# Altium integrated library Mylib Rev 4.IntLib: 207 symbols (part 2 of 3) (continued)
## Header 13
designator P?
Header, 13-Pin; ASiD Part Number: Header 13-AS
footprint MY_1X13_Black
footprint MY_FE13
footprint MY_FE13W
footprint MY_MA13-1
footprint MY_MA13-1W
pins: 1, 2, 3, 4, 5, 6, 7, 8, 9, 10, 11, 12, 13

## Header 13X2
designator P?  (value not drawn)
Header, 26-Pin, Dual row; ASiD Part Number: Header 13X2-AS
footprint My_2X13
footprint MY_2X13_BOX
footprint MY_ML26L
footprint MY_FE13-2
footprint MY_FE13-2W
footprint MY_MA13-2W
pins: 1, 2, 3, 4, 5, 6, 7, 8, 9, 10, 11, 12, 13, 14, 15, 16, 17, 18, 19, 20, 21, 22, 23, 24, 25, 26

## Header 14
designator P?  (value not drawn)
Header, 14-Pin; ASiD Part Number: Header 14-AS
footprint My_1X14
signal-integrity model Connector
footprint MY_FE14
footprint MY_FE14W
footprint MY_MA14-1W
pins: 1, 2, 3, 4, 5, 6, 7, 8, 9, 10, 11, 12, 13, 14

## Header 15
designator P?  (value not drawn)
Header, 15-Pin; ASiD Part Number: Header 15-AS
signal-integrity model Connector
footprint MY_53253-1570
footprint MY_FE15
footprint MY_FE15W
footprint MY_1x15
footprint MY_MA15-1W
pins: 1, 2, 3, 4, 5, 6, 7, 8, 9, 10, 11, 12, 13, 14, 15

## Header 15X2
designator P?
Header, 30-Pin, Dual row; ASiD Part Number: Header 15X2-AS
footprint MY_FE15-2
footprint MY_FE15-2W
footprint MY_MA15-2W
footprint MY_2X15
pins: 1, 2, 3, 4, 5, 6, 7, 8, 9, 10, 11, 12, 13, 14, 15, 16, 17, 18, 19, 20, 21, 22, 23, 24, 25, 26, 27, 28, 29, 30

## Header 16
designator P?  (value not drawn)
Header, 16-Pin; ASiD Part Number: Header 16-AS
footprint My_1X16
signal-integrity model Connector
footprint MY_FE16
footprint MY_FE16W
footprint MY_MA16-1W
pins: 1, 2, 3, 4, 5, 6, 7, 8, 9, 10, 11, 12, 13, 14, 15, 16

## Header 16X2
designator P?
Header, 32-Pin, Dual row; ASiD Part Number: Header 16X2-AS
footprint MY_16X2
footprint MY_16X2R
footprint MY_2x16
footprint MY_FE16-2
footprint MY_FE16-2W
footprint MY_MA16-2W
pins: 1, 2, 3, 4, 5, 6, 7, 8, 9, 10, 11, 12, 13, 14, 15, 16, 17, 18, 19, 20, 21, 22, 23, 24, 25, 26, 27, 28, 29, 30, 31, 32

## Header 17
designator P?  (value not drawn)
Header, 17-Pin; ASiD Part Number: Header 17-AS
signal-integrity model Connector
footprint MY_FE17
footprint MY_FE17W
footprint My_1X17 (Footprint not found)
footprint MY_MA17-1W
pins: 1, 2, 3, 4, 5, 6, 7, 8, 9, 10, 11, 12, 13, 14, 15, 16, 17

## Header 17X2
designator P?  (value not drawn)
Header, 34-Pin, Dual row; ASiD Part Number: Header 17X2-AS
footprint MY_2X17_BOX
footprint MY_2x17
footprint MY_ML34L
footprint MY_FE17-2
footprint MY_FE17-2W
footprint MY_MA17-2W
pins: 1, 2, 3, 4, 5, 6, 7, 8, 9, 10, 11, 12, 13, 14, 15, 16, 17, 18, 19, 20, 21, 22, 23, 24, 25, 26, 27, 28, 29, 30, 31, 32, 33, 34

## Header 20
designator P?  (value not drawn)
Header, 20-Pin; ASiD Part Number: Header 20-AS
signal-integrity model Connector
footprint MY_FE20
footprint MY_FE20W
footprint My_1X20
footprint MY_MA20-1W
pins: 1, 2, 3, 4, 5, 6, 7, 8, 9, 10, 11, 12, 13, 14, 15, 16, 17, 18, 19, 20

## Header 20X2
designator P?
Header, 40-Pin, Dual row; ASiD Part Number: Header 20X2-AS
signal-integrity model Connector
footprint My_IDCM40A
footprint My_IDCRM40
footprint MY_2X20
footprint My_2X20_BOX
footprint MY_ML40L
footprint MY_FE20-2
footprint MY_FE20-2W
footprint MY_MA20-2W
pins: 1, 2, 3, 4, 5, 6, 7, 8, 9, 10, 11, 12, 13, 14, 15, 16, 17, 18, 19, 20, 21, 22, 23, 24, 25, 26, 27, 28, 29, 30, 31, 32, 33, 34, 35, 36, 37, 38, 39, 40

## Header 40
designator P?  (value not drawn)
Header, 40-Pin; ASiD Part Number: Header 40-AS
signal-integrity model Connector
footprint MY_FE40
footprint MY_MA40-1
footprint MY_MA40-1W
footprint MY_FE40W
pins: 1, 2, 3, 4, 5, 6, 7, 8, 9, 10, 11, 12, 13, 14, 15, 16, 17, 18, 19, 20, 21, 22, 23, 24, 25, 26, 27, 28, 29, 30, 31, 32, 33, 34, 35, 36, 37, 38, 39, 40

## Header 40X2
designator P?
Header, 80-Pin, Dual row; ASiD Part Number: Header 40X2-AS
signal-integrity model Connector
footprint MY_2X40
footprint MY_FE40-2
footprint MY_FE40-2W
footprint MY_MA40-2W
pins: 1, 2, 3, 4, 5, 6, 7, 8, 9, 10, 11, 12, 13, 14, 15, 16, 17, 18, 19, 20, 21, 22, 23, 24, 25, 26, 27, 28, 29, 30, 31, 32, 33, 34, 35, 36, 37, 38, 39, 40, 41, 42, 43, 44, 45, 46, 47, 48, 49, 50, 51, 52, 53, 54, 55, 56, 57, 58, 59, 60, 61, 62, 63, 64, 65, 66, 67, 68, 69, 70, 71, 72, 73, 74, 75, 76, 77, 78, 79, 80

## HeadPhone
designator J?, comment Phonejack Stereo
ASiD Part Number: Phonejack Stereo-AS
footprint MY_HeadPhone_1
footprint MY_HeadPhone_2
pins: 1, 2, 3, 4, 5

## Heat  sink
designator H?
ASiD Part Number: Heat  sink-AS
footprint My_Heat_sink_sqr
footprint My_Heat_sink_TO22
footprint My_Heat_sink_TO22a
footprint MY_Heat_Sink_HS_27
footprint MY_Heat_Sink_HS_28
pins: 1

## IDTQS3861
designator U?, comment 10-BIT BUS SWITCH  (value not drawn)
HIGH-SPEED CMOS 10-BIT BUS SWITCH WITH FLOW-THROUGH PINOUT; ASiD Part Number: IDTQS3861-AS
footprint MY_QSOP24
pins: 2 A0 (io), 3 A1 (io), 4 A2 (io), 5 A3 (io), 6 A4 (io), 7 A5 (io), 8 A6 (io), 9 A7 (io), 10 A8 (io), 11 A9 (io), 12 GND (power), 13 B9 (io), 14 B8 (io), 15 B7 (io), 16 B6 (io), 17 B5 (io), 18 B4 (io), 19 B3 (io), 20 B2 (io), 21 B1 (io), 22 B0 (io), 23 ~{B}E (in), 24 VCC (power)

## Inductor
designator L?, comment 100uH
Inductor; ASiD Part Number: Inductor-AS; Current: 1A; Value: 100uH
footprint MY_Coil
footprint MY_0805
footprint MY_1206
footprint MY_1210
footprint MY_1310
footprint MY_1608
footprint MY_1812
footprint MY_1825
footprint MY_2012
footprint MY_2220
footprint MY_2225
footprint MY_3216
footprint MY_3225
footprint MY_4532
footprint MY_4564
footprint MY_DR73
footprint MY_DR125
footprint MY_ED16
footprint MY_ED22
footprint MY_ED26
footprint MY_ED38
footprint MY_ED43
footprint MY_SFT830D
footprint MY_SFT830S
footprint MY_SFT1030
footprint MY_SFT840D
footprint MY_SFT1040
footprint MY_SFT1240
footprint MY_0201
footprint MY_0402
footprint MY_0603
footprint MY_10mm_Self
footprint MY_2010
footprint MY_1218
footprint MY_SLF6028
footprint MY_DR1030
footprint MY_2512 (R2512)
pins: 1, 2

## Joystick Nokia 6600
designator J?
Joystick keypad; ASiD Part Number: Joystick Nokia 6600-AS
footprint MY_6600_Joystick
pins: C, Com C, D, L, R, Shild, U

## Jumper
designator W?
Jumper Wire; ASiD Part Number: Jumper-AS
footprint My_1X02
footprint MY_JUMPER_5mm
footprint MY_JUMPER_7mm
footprint MY_JUMPER_10mm
footprint MY_JUMPER_12mm
footprint MY_JUMPER_15mm
footprint MY_JUMPER_20mm
footprint MY_JUMPER_25mm
footprint MY_JUMPER_30mm
footprint MY_0805
pins: 1, 2

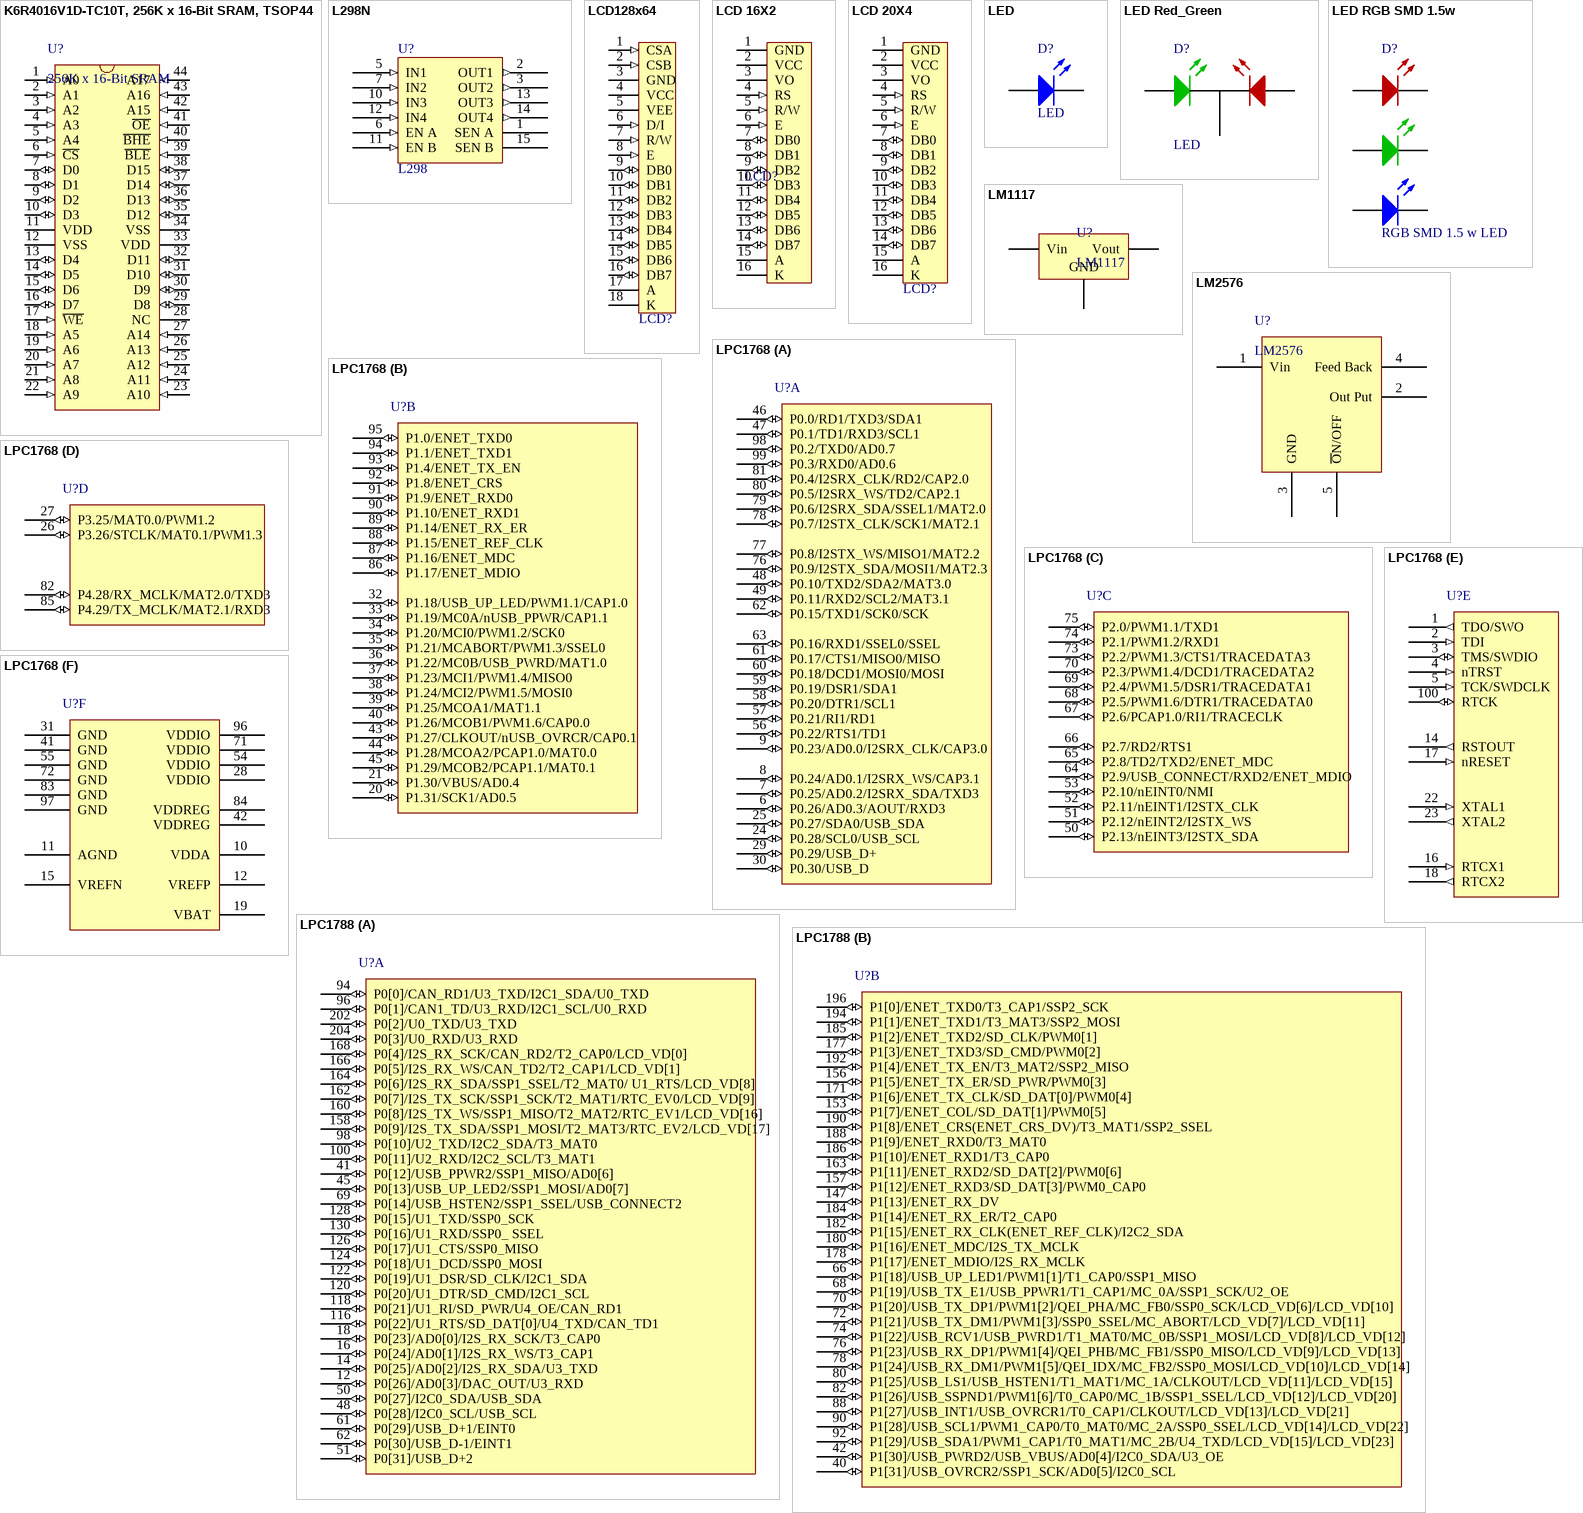
[diagram p11: symbols K6R4016V1D-TC10T, 256K x 16-Bit SRAM, TSOP44 to LPC1788]

## K6R4016V1D-TC10T, 256K x 16-Bit SRAM, TSOP44
designator U?, comment 256K x 16-Bit SRAM
ASiD Part Number: K6R4016V1D-TC10T-AS
footprint MY_TSOP44
pins: 1 A0 (in), 2 A1 (in), 3 A2 (in), 4 A3 (in), 5 A4 (in), 6 ~{CS} (in), 7 D0 (io), 8 D1 (io), 9 D2 (io), 10 D3 (io), 11 VDD (power), 12 VSS (power), 13 D4 (io), 14 D5 (io), 15 D6 (io), 16 D7 (io), 17 ~{WE} (in), 18 A5 (in), 19 A6 (in), 20 A7 (in), 21 A8 (in), 22 A9 (in), 23 A10 (in), 24 A11 (in), 25 A12 (in), 26 A13 (in), 27 A14 (in), 28 NC, 29 D8 (io), 30 D9 (io), 31 D10 (io), 32 D11 (io), 33 VDD (power), 34 VSS (power), 35 D12 (io), 36 D13 (io), 37 D14 (io), 38 D15 (io), 39 ~{BLE} (in), 40 ~{BHE} (in), 41 ~{OE} (in), 42 A15 (in), 43 A16 (in), 44 A17 (in)

## L298N
designator U?, comment L298
Dual Full Bridge Driver; ASiD Part Number: L298N-AS
footprint My_ZIP15V
pins: 1 SEN A, 2 OUT1 (out), 3 OUT2 (out), 4 VS (power) hidden to VS, 5 IN1 (in), 6 EN A (in), 7 IN2 (in), 8 GND (power) hidden to GND, 9 VSS (power) hidden to VSS, 10 IN3 (in), 11 EN B (in), 12 IN4 (in), 13 OUT3 (out), 14 OUT4 (out), 15 SEN B

## LCD128x64
designator LCD?, comment LCD 128X64  (value not drawn)
Graphic LCD with KS108 Controller; ASiD Part Number: LCD128x64-AS
footprint My_LCD128x64_A
footprint My_LCD128x64_B
pins: 1 CSA (in), 2 CSB (in), 3 GND (power), 4 VCC (power), 5 VEE (power), 6 D/I (in), 7 R/W (in), 8 E (in), 9 DB0 (io), 10 DB1 (io), 11 DB2 (io), 12 DB3 (io), 13 DB4 (io), 14 DB5 (io), 15 DB6 (io), 16 DB7 (io), 17 A, 18 K

## LCD 16X2
designator LCD?  (value not drawn)
LCD 16X2 Character lcd; ASiD Part Number: LCD 16X2-AS
footprint My_LCD 16x2-A
pins: 1 GND (power), 2 VCC (power), 3 VO, 4 RS (in), 5 R/W (in), 6 E (in), 7 DB0 (io), 8 DB1 (io), 9 DB2 (io), 10 DB3 (io), 11 DB4 (io), 12 DB5 (io), 13 DB6 (io), 14 DB7 (io), 15 A, 16 K

## LCD 20X4
designator LCD?  (value not drawn)
LCD 20X4 Character lcd; ASiD Part Number: LCD 20X4-AS
footprint My_LCD 20x4-A
footprint My_LCD 20x4-B
pins: 1 GND (power), 2 VCC (power), 3 VO, 4 RS (in), 5 R/W (in), 6 E (in), 7 DB0 (io), 8 DB1 (io), 9 DB2 (io), 10 DB3 (io), 11 DB4 (io), 12 DB5 (io), 13 DB6 (io), 14 DB7 (io), 15 A, 16 K

## LED
designator D?
Typical INFRARED GaAs LED; ASiD Part Number: LED-AS
footprint My_LED3MM
footprint MY_LED5MM
footprint MY_SQ_LED
footprint MY_LED_0805
footprint MY_LED_1206
pins: A, K

## LED Red_Green
designator D?, comment LED
Typical INFRARED GaAs LED; ASiD Part Number: LED Red_Green-AS
footprint My_DUOLED5MM
pins: AG, AR, K

## LED RGB SMD 1.5w
designator D?, comment RGB SMD 1.5 w LED
Enhanced Power RGB LED; ASiD Part Number: LED RGB SMD 1.5w-AS
footprint MY_RGB_SMD_1.5w
pins: AB A, AG A, AR A, KB K, KG K, KR K

## LM1117
designator U?
Low Drop Voltage Reg; ASiD Part Number: LM1117-AS
footprint MY_SOT223
pins: 1 GND, 2 Vout, 3 Vin

## LM2576
designator U?
SIMPLE SWITCHER® 3A Step-Down Voltage Regulator; ASiD Part Number: LM2576-AS
footprint MY_TO263
pins: 1 Vin, 2 Out Put, 3 GND, 4 Feed Back, 5 ~{O}N/OFF

## LPC1768
designator U?  (value not drawn)
ARM Cortex-M3 based microcontroller; ASiD Part Number: LPC1768FBD100-AS
footprint MY_TQFP100
part A pins: 6 P0.26/AD0.3/AOUT/RXD3 (io), 7 P0.25/AD0.2/I2SRX_SDA/TXD3 (io), 8 P0.24/AD0.1/I2SRX_WS/CAP3.1 (io), 9 P0.23/AD0.0/I2SRX_CLK/CAP3.0 (io), 24 P0.28/SCL0/USB_SCL (io), 25 P0.27/SDA0/USB_SDA (io), 29 P0.29/USB_D+ (io), 30 P0.30/USB_D (io), 46 P0.0/RD1/TXD3/SDA1 (io), 47 P0.1/TD1/RXD3/SCL1 (io), 48 P0.10/TXD2/SDA2/MAT3.0 (io), 49 P0.11/RXD2/SCL2/MAT3.1 (io), 56 P0.22/RTS1/TD1 (io), 57 P0.21/RI1/RD1 (io), 58 P0.20/DTR1/SCL1 (io), 59 P0.19/DSR1/SDA1 (io), 60 P0.18/DCD1/MOSI0/MOSI (io), 61 P0.17/CTS1/MISO0/MISO (io), 62 P0.15/TXD1/SCK0/SCK (io), 63 P0.16/RXD1/SSEL0/SSEL (io), 76 P0.9/I2STX_SDA/MOSI1/MAT2.3 (io), 77 P0.8/I2STX_WS/MISO1/MAT2.2 (io), 78 P0.7/I2STX_CLK/SCK1/MAT2.1 (io), 79 P0.6/I2SRX_SDA/SSEL1/MAT2.0 (io), 80 P0.5/I2SRX_WS/TD2/CAP2.1 (io), 81 P0.4/I2SRX_CLK/RD2/CAP2.0 (io), 98 P0.2/TXD0/AD0.7 (io), 99 P0.3/RXD0/AD0.6 (io)
part B pins: 20 P1.31/SCK1/AD0.5 (io), 21 P1.30/VBUS/AD0.4 (io), 32 P1.18/USB_UP_LED/PWM1.1/CAP1.0 (io), 33 P1.19/MC0A/nUSB_PPWR/CAP1.1 (io), 34 P1.20/MCI0/PWM1.2/SCK0 (io), 35 P1.21/MCABORT/PWM1.3/SSEL0 (io), 36 P1.22/MC0B/USB_PWRD/MAT1.0 (io), 37 P1.23/MCI1/PWM1.4/MISO0 (io), 38 P1.24/MCI2/PWM1.5/MOSI0 (io), 39 P1.25/MCOA1/MAT1.1 (io), 40 P1.26/MCOB1/PWM1.6/CAP0.0 (io), 43 P1.27/CLKOUT/nUSB_OVRCR/CAP0.1 (io), 44 P1.28/MCOA2/PCAP1.0/MAT0.0 (io), 45 P1.29/MCOB2/PCAP1.1/MAT0.1 (io), 86 P1.17/ENET_MDIO (io), 87 P1.16/ENET_MDC (io), 88 P1.15/ENET_REF_CLK (io), 89 P1.14/ENET_RX_ER (io), 90 P1.10/ENET_RXD1 (io), 91 P1.9/ENET_RXD0 (io), 92 P1.8/ENET_CRS (io), 93 P1.4/ENET_TX_EN (io), 94 P1.1/ENET_TXD1 (io), 95 P1.0/ENET_TXD0 (io)
part C pins: 50 P2.13/nEINT3/I2STX_SDA (io), 51 P2.12/nEINT2/I2STX_WS (io), 52 P2.11/nEINT1/I2STX_CLK (io), 53 P2.10/nEINT0/NMI (io), 64 P2.9/USB_CONNECT/RXD2/ENET_MDIO (io), 65 P2.8/TD2/TXD2/ENET_MDC (io), 66 P2.7/RD2/RTS1 (io), 67 P2.6/PCAP1.0/RI1/TRACECLK (io), 68 P2.5/PWM1.6/DTR1/TRACEDATA0 (io), 69 P2.4/PWM1.5/DSR1/TRACEDATA1 (io), 70 P2.3/PWM1.4/DCD1/TRACEDATA2 (io), 73 P2.2/PWM1.3/CTS1/TRACEDATA3 (io), 74 P2.1/PWM1.2/RXD1 (io), 75 P2.0/PWM1.1/TXD1 (io)
part D pins: 26 P3.26/STCLK/MAT0.1/PWM1.3 (io), 27 P3.25/MAT0.0/PWM1.2 (io), 82 P4.28/RX_MCLK/MAT2.0/TXD3 (io), 85 P4.29/TX_MCLK/MAT2.1/RXD3 (io)
part E pins: 1 TDO/SWO (out), 2 TDI (in), 3 TMS/SWDIO (io), 4 nTRST (in), 5 TCK/SWDCLK (in), 14 RSTOUT (out), 16 RTCX1 (in), 17 nRESET (in), 18 RTCX2 (out), 22 XTAL1 (in), 23 XTAL2 (out), 100 RTCK (io)
part F pins: 10 VDDA (power), 11 AGND (power), 12 VREFP (power), 15 VREFN (power), 19 VBAT (power), 28 VDDIO (power), 31 GND (power), 41 GND (power), 42 VDDREG (power), 54 VDDIO (power), 55 GND (power), 71 VDDIO (power), 72 GND (power), 83 GND (power), 84 VDDREG (power), 96 VDDIO (power), 97 GND (power)

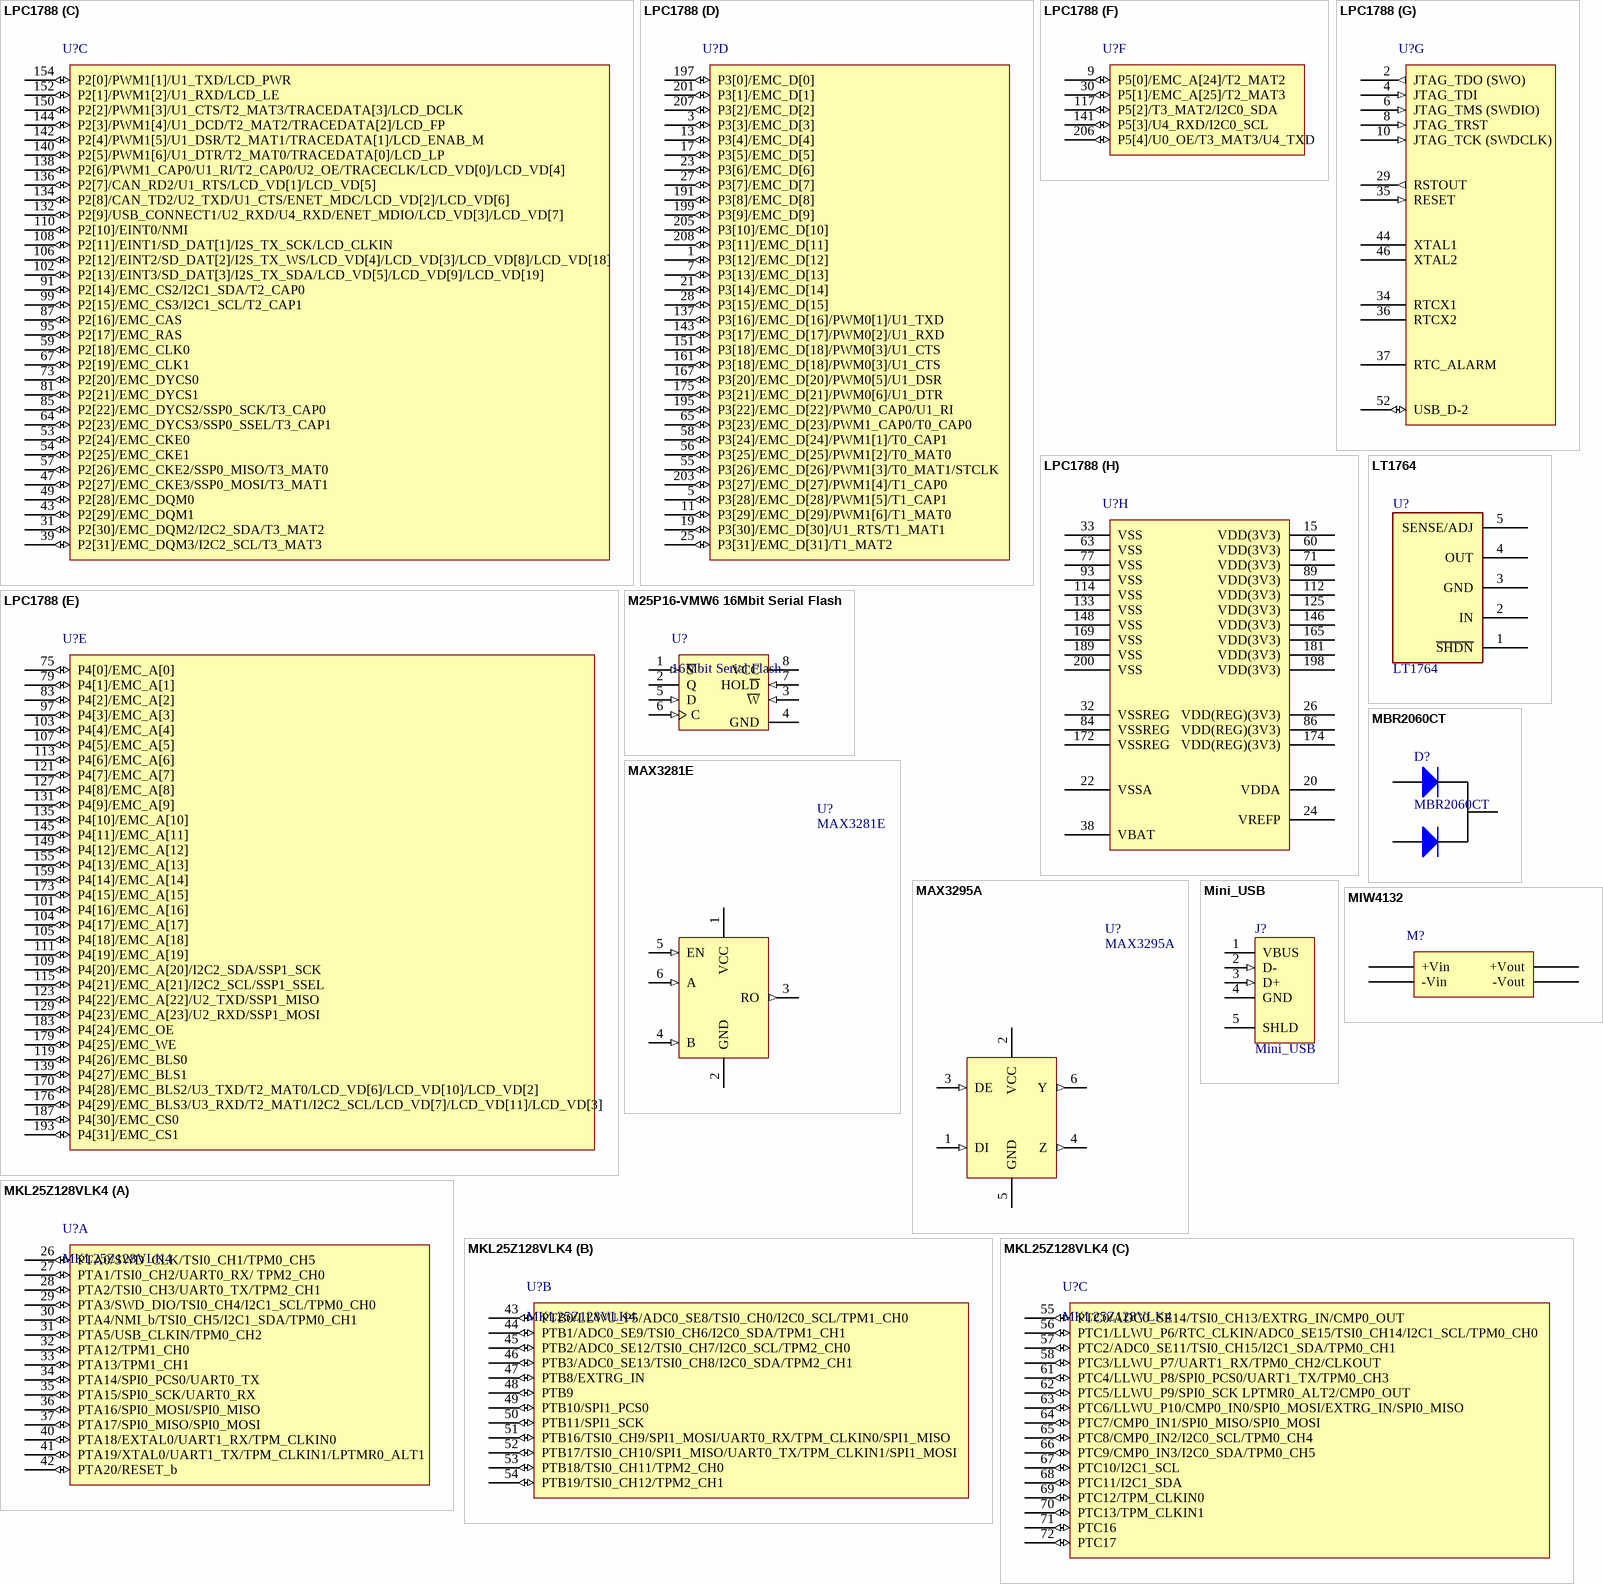
[diagram p12: symbols LPC1788 to MKL25Z128VLK4]

## LPC1788
designator U?  (value not drawn)
ARM Cortex-M3 based microcontroller; ASiD Part Number: LPC1788FBD208-AS
footprint MY_PQFP208
part A pins: 12 P0[26]/AD0[3]/DAC_OUT/U3_RXD (io), 14 P0[25]/AD0[2]/I2S_RX_SDA/U3_TXD (io), 16 P0[24]/AD0[1]/I2S_RX_WS/T3_CAP1 (io), 18 P0[23]/AD0[0]/I2S_RX_SCK/T3_CAP0 (io), 41 P0[12]/USB_PPWR2/SSP1_MISO/AD0[6] (io), 45 P0[13]/USB_UP_LED2/SSP1_MOSI/AD0[7] (io), 48 P0[28]/I2C0_SCL/USB_SCL (io), 50 P0[27]/I2C0_SDA/USB_SDA (io), 51 P0[31]/USB_D+2 (io), 61 P0[29]/USB_D+1/EINT0 (io), 62 P0[30]/USB_D-1/EINT1 (io), 69 P0[14]/USB_HSTEN2/SSP1_SSEL/USB_CONNECT2 (io), 94 P0[0]/CAN_RD1/U3_TXD/I2C1_SDA/U0_TXD (io), 96 P0[1]/CAN1_TD/U3_RXD/I2C1_SCL/U0_RXD (io), 98 P0[10]/U2_TXD/I2C2_SDA/T3_MAT0 (io), 100 P0[11]/U2_RXD/I2C2_SCL/T3_MAT1 (io), 116 P0[22]/U1_RTS/SD_DAT[0]/U4_TXD/CAN_TD1 (io), 118 P0[21]/U1_RI/SD_PWR/U4_OE/CAN_RD1 (io), 120 P0[20]/U1_DTR/SD_CMD/I2C1_SCL (io), 122 P0[19]/U1_DSR/SD_CLK/I2C1_SDA (io), 124 P0[18]/U1_DCD/SSP0_MOSI (io), 126 P0[17]/U1_CTS/SSP0_MISO (io), 128 P0[15]/U1_TXD/SSP0_SCK (io), 130 P0[16]/U1_RXD/SSP0_ SSEL (io), 158 P0[9]/I2S_TX_SDA/SSP1_MOSI/T2_MAT3/RTC_EV2/LCD_VD[17] (io), 160 P0[8]/I2S_TX_WS/SSP1_MISO/T2_MAT2/RTC_EV1/LCD_VD[16] (io), 162 P0[7]/I2S_TX_SCK/SSP1_SCK/T2_MAT1/RTC_EV0/LCD_VD[9] (io), 164 P0[6]/I2S_RX_SDA/SSP1_SSEL/T2_MAT0/ U1_RTS/LCD_VD[8] (io), 166 P0[5]/I2S_RX_WS/CAN_TD2/T2_CAP1/LCD_VD[1] (io), 168 P0[4]/I2S_RX_SCK/CAN_RD2/T2_CAP0/LCD_VD[0] (io), 202 P0[2]/U0_TXD/U3_TXD (io), 204 P0[3]/U0_RXD/U3_RXD (io)
part B pins: 40 P1[31]/USB_OVRCR2/SSP1_SCK/AD0[5]/I2C0_SCL (io), 42 P1[30]/USB_PWRD2/USB_VBUS/AD0[4]/I2C0_SDA/U3_OE (io), 66 P1[18]/USB_UP_LED1/PWM1[1]/T1_CAP0/SSP1_MISO (io), 68 P1[19]/USB_TX_E1/USB_PPWR1/T1_CAP1/MC_0A/SSP1_SCK/U2_OE (io), 70 P1[20]/USB_TX_DP1/PWM1[2]/QEI_PHA/MC_FB0/SSP0_SCK/LCD_VD[6]/LCD_VD[10] (io), 72 P1[21]/USB_TX_DM1/PWM1[3]/SSP0_SSEL/MC_ABORT/LCD_VD[7]/LCD_VD[11] (io), 74 P1[22]/USB_RCV1/USB_PWRD1/T1_MAT0/MC_0B/SSP1_MOSI/LCD_VD[8]/LCD_VD[12] (io), 76 P1[23]/USB_RX_DP1/PWM1[4]/QEI_PHB/MC_FB1/SSP0_MISO/LCD_VD[9]/LCD_VD[13] (io), 78 P1[24]/USB_RX_DM1/PWM1[5]/QEI_IDX/MC_FB2/SSP0_MOSI/LCD_VD[10]/LCD_VD[14] (io), 80 P1[25]/USB_LS1/USB_HSTEN1/T1_MAT1/MC_1A/CLKOUT/LCD_VD[11]/LCD_VD[15] (io), 82 P1[26]/USB_SSPND1/PWM1[6]/T0_CAP0/MC_1B/SSP1_SSEL/LCD_VD[12]/LCD_VD[20] (io), 88 P1[27]/USB_INT1/USB_OVRCR1/T0_CAP1/CLKOUT/LCD_VD[13]/LCD_VD[21] (io), 90 P1[28]/USB_SCL1/PWM1_CAP0/T0_MAT0/MC_2A/SSP0_SSEL/LCD_VD[14]/LCD_VD[22] (io), 92 P1[29]/USB_SDA1/PWM1_CAP1/T0_MAT1/MC_2B/U4_TXD/LCD_VD[15]/LCD_VD[23] (io), 147 P1[13]/ENET_RX_DV (io), 153 P1[7]/ENET_COL/SD_DAT[1]/PWM0[5] (io), 156 P1[5]/ENET_TX_ER/SD_PWR/PWM0[3] (io), 157 P1[12]/ENET_RXD3/SD_DAT[3]/PWM0_CAP0 (io), 163 P1[11]/ENET_RXD2/SD_DAT[2]/PWM0[6] (io), 171 P1[6]/ENET_TX_CLK/SD_DAT[0]/PWM0[4] (io), 177 P1[3]/ENET_TXD3/SD_CMD/PWM0[2] (io), 178 P1[17]/ENET_MDIO/I2S_RX_MCLK (io), 180 P1[16]/ENET_MDC/I2S_TX_MCLK (io), 182 P1[15]/ENET_RX_CLK(ENET_REF_CLK)/I2C2_SDA (io), 184 P1[14]/ENET_RX_ER/T2_CAP0 (io), 185 P1[2]/ENET_TXD2/SD_CLK/PWM0[1] (io), 186 P1[10]/ENET_RXD1/T3_CAP0 (io), 188 P1[9]/ENET_RXD0/T3_MAT0 (io), 190 P1[8]/ENET_CRS(ENET_CRS_DV)/T3_MAT1/SSP2_SSEL (io), 192 P1[4]/ENET_TX_EN/T3_MAT2/SSP2_MISO (io), 194 P1[1]/ENET_TXD1/T3_MAT3/SSP2_MOSI (io), 196 P1[0]/ENET_TXD0/T3_CAP1/SSP2_SCK (io)
part C pins: 31 P2[30]/EMC_DQM2/I2C2_SDA/T3_MAT2 (io), 39 P2[31]/EMC_DQM3/I2C2_SCL/T3_MAT3 (io), 43 P2[29]/EMC_DQM1 (io), 47 P2[27]/EMC_CKE3/SSP0_MOSI/T3_MAT1 (io), 49 P2[28]/EMC_DQM0 (io), 53 P2[24]/EMC_CKE0 (io), 54 P2[25]/EMC_CKE1 (io), 57 P2[26]/EMC_CKE2/SSP0_MISO/T3_MAT0 (io), 59 P2[18]/EMC_CLK0 (io), 64 P2[23]/EMC_DYCS3/SSP0_SSEL/T3_CAP1 (io), 67 P2[19]/EMC_CLK1 (io), 73 P2[20]/EMC_DYCS0 (io), 81 P2[21]/EMC_DYCS1 (io), 85 P2[22]/EMC_DYCS2/SSP0_SCK/T3_CAP0 (io), 87 P2[16]/EMC_CAS (io), 91 P2[14]/EMC_CS2/I2C1_SDA/T2_CAP0 (io), 95 P2[17]/EMC_RAS (io), 99 P2[15]/EMC_CS3/I2C1_SCL/T2_CAP1 (io), 102 P2[13]/EINT3/SD_DAT[3]/I2S_TX_SDA/LCD_VD[5]/LCD_VD[9]/LCD_VD[19] (io), 106 P2[12]/EINT2/SD_DAT[2]/I2S_TX_WS/LCD_VD[4]/LCD_VD[3]/LCD_VD[8]/LCD_VD[18] (io), 108 P2[11]/EINT1/SD_DAT[1]/I2S_TX_SCK/LCD_CLKIN (io), 110 P2[10]/EINT0/NMI (io), 132 P2[9]/USB_CONNECT1/U2_RXD/U4_RXD/ENET_MDIO/LCD_VD[3]/LCD_VD[7] (io), 134 P2[8]/CAN_TD2/U2_TXD/U1_CTS/ENET_MDC/LCD_VD[2]/LCD_VD[6] (io), 136 P2[7]/CAN_RD2/U1_RTS/LCD_VD[1]/LCD_VD[5] (io), 138 P2[6]/PWM1_CAP0/U1_RI/T2_CAP0/U2_OE/TRACECLK/LCD_VD[0]/LCD_VD[4] (io), 140 P2[5]/PWM1[6]/U1_DTR/T2_MAT0/TRACEDATA[0]/LCD_LP (io), 142 P2[4]/PWM1[5]/U1_DSR/T2_MAT1/TRACEDATA[1]/LCD_ENAB_M (io), 144 P2[3]/PWM1[4]/U1_DCD/T2_MAT2/TRACEDATA[2]/LCD_FP (io), 150 P2[2]/PWM1[3]/U1_CTS/T2_MAT3/TRACEDATA[3]/LCD_DCLK (io), 152 P2[1]/PWM1[2]/U1_RXD/LCD_LE (io), 154 P2[0]/PWM1[1]/U1_TXD/LCD_PWR (io)
part D pins: 1 P3[12]/EMC_D[12] (io), 3 P3[3]/EMC_D[3] (io), 5 P3[28]/EMC_D[28]/PWM1[5]/T1_CAP1 (io), 7 P3[13]/EMC_D[13] (io), 11 P3[29]/EMC_D[29]/PWM1[6]/T1_MAT0 (io), 13 P3[4]/EMC_D[4] (io), 17 P3[5]/EMC_D[5] (io), 19 P3[30]/EMC_D[30]/U1_RTS/T1_MAT1 (io), 21 P3[14]/EMC_D[14] (io), 23 P3[6]/EMC_D[6] (io), 25 P3[31]/EMC_D[31]/T1_MAT2 (io), 27 P3[7]/EMC_D[7] (io), 28 P3[15]/EMC_D[15] (io), 55 P3[26]/EMC_D[26]/PWM1[3]/T0_MAT1/STCLK (io), 56 P3[25]/EMC_D[25]/PWM1[2]/T0_MAT0 (io), 58 P3[24]/EMC_D[24]/PWM1[1]/T0_CAP1 (io), 65 P3[23]/EMC_D[23]/PWM1_CAP0/T0_CAP0 (io), 137 P3[16]/EMC_D[16]/PWM0[1]/U1_TXD (io), 143 P3[17]/EMC_D[17]/PWM0[2]/U1_RXD (io), 151 P3[18]/EMC_D[18]/PWM0[3]/U1_CTS (io), 161 P3[18]/EMC_D[18]/PWM0[3]/U1_CTS (io), 167 P3[20]/EMC_D[20]/PWM0[5]/U1_DSR (io), 175 P3[21]/EMC_D[21]/PWM0[6]/U1_DTR (io), 191 P3[8]/EMC_D[8] (io), 195 P3[22]/EMC_D[22]/PWM0_CAP0/U1_RI (io), 197 P3[0]/EMC_D[0] (io), 199 P3[9]/EMC_D[9] (io), 201 P3[1]/EMC_D[1] (io), 203 P3[27]/EMC_D[27]/PWM1[4]/T1_CAP0 (io), 205 P3[10]/EMC_D[10] (io), 207 P3[2]/EMC_D[2] (io), 208 P3[11]/EMC_D[11] (io)
part E pins: 75 P4[0]/EMC_A[0] (io), 79 P4[1]/EMC_A[1] (io), 83 P4[2]/EMC_A[2] (io), 97 P4[3]/EMC_A[3] (io), 101 P4[16]/EMC_A[16] (io), 103 P4[4]/EMC_A[4] (io), 104 P4[17]/EMC_A[17] (io), 105 P4[18]/EMC_A[18] (io), 107 P4[5]/EMC_A[5] (io), 109 P4[20]/EMC_A[20]/I2C2_SDA/SSP1_SCK (io), 111 P4[19]/EMC_A[19] (io), 113 P4[6]/EMC_A[6] (io), 115 P4[21]/EMC_A[21]/I2C2_SCL/SSP1_SSEL (io), 119 P4[26]/EMC_BLS0 (io), 121 P4[7]/EMC_A[7] (io), 123 P4[22]/EMC_A[22]/U2_TXD/SSP1_MISO (io), 127 P4[8]/EMC_A[8] (io), 129 P4[23]/EMC_A[23]/U2_RXD/SSP1_MOSI (io), 131 P4[9]/EMC_A[9] (io), 135 P4[10]/EMC_A[10] (io), 139 P4[27]/EMC_BLS1 (io), 145 P4[11]/EMC_A[11] (io), 149 P4[12]/EMC_A[12] (io), 155 P4[13]/EMC_A[13] (io), 159 P4[14]/EMC_A[14] (io), 170 P4[28]/EMC_BLS2/U3_TXD/T2_MAT0/LCD_VD[6]/LCD_VD[10]/LCD_VD[2] (io), 173 P4[15]/EMC_A[15] (io), 176 P4[29]/EMC_BLS3/U3_RXD/T2_MAT1/I2C2_SCL/LCD_VD[7]/LCD_VD[11]/LCD_VD[3] (io), 179 P4[25]/EMC_WE (io), 183 P4[24]/EMC_OE (io), 187 P4[30]/EMC_CS0 (io), 193 P4[31]/EMC_CS1 (io)
part F pins: 9 P5[0]/EMC_A[24]/T2_MAT2 (io), 30 P5[1]/EMC_A[25]/T2_MAT3 (io), 117 P5[2]/T3_MAT2/I2C0_SDA (io), 141 P5[3]/U4_RXD/I2C0_SCL (io), 206 P5[4]/U0_OE/T3_MAT3/U4_TXD (io)
part G pins: 2 JTAG_TDO (SWO) (out), 4 JTAG_TDI (in), 6 JTAG_TMS (SWDIO) (in), 8 JTAG_TRST (in), 10 JTAG_TCK (SWDCLK) (in), 29 RSTOUT (out), 34 RTCX1, 35 RESET (in), 36 RTCX2, 37 RTC_ALARM (oc), 44 XTAL1, 46 XTAL2, 52 USB_D-2 (io)
part H pins: 15 VDD(3V3) (power), 20 VDDA (power), 22 VSSA (power), 24 VREFP (power), 26 VDD(REG)(3V3) (power), 32 VSSREG (power), 33 VSS (power), 38 VBAT (power), 60 VDD(3V3) (power), 63 VSS (power), 71 VDD(3V3) (power), 77 VSS (power), 84 VSSREG (power), 86 VDD(REG)(3V3) (power), 89 VDD(3V3) (power), 93 VSS (power), 112 VDD(3V3) (power), 114 VSS (power), 125 VDD(3V3) (power), 133 VSS (power), 146 VDD(3V3) (power), 148 VSS (power), 165 VDD(3V3) (power), 169 VSS (power), 172 VSSREG (power), 174 VDD(REG)(3V3) (power), 181 VDD(3V3) (power), 189 VSS (power), 198 VDD(3V3) (power), 200 VSS (power)

## LT1764
designator U?
3A, Fast Transient  Response, Low Noise,  LDO Regulator; ASiD Part Number: LT1764-AS
footprint MY_TO263
pins: 1 ~{SHDN}, 2 IN, 3 GND, 4 OUT, 5 SENSE/ADJ

## M25P16-VMW6 16Mbit Serial Flash
designator U?, comment 16Mbit Serial Flash
ASiD Part Number: M25P16-VMW6-AS
footprint My_SOIC_P8W (SOIC, 8-Leads, Body 5.24x5.24mm, Pitch 1.27mm, IPC Medium Density)
pins: 1 ~{S} (in), 2 Q (hiz) "Serial Output", 3 ~{W} (in) "Serial Output", 4 GND (power) "Serial Output", 5 D (in) "Serial Input", 6 C (in) "Serial Input", 7 HOL~{D} (in) "Serial Input", 8 VCC (power) "Serial Input"

## MAX3281E
designator U?
±15kV ESD-Protected 52Mbps, 3V to 5.5V,  SOT23 RS-485/RS-422 True Fail-Safe Receivers; ASiD Part Number: MAX3281E-AS
footprint MY_SOT23-6
pins: 1 VCC (power), 2 GND (power), 3 RO (out), 4 B (in), 5 EN (in), 6 A (in)

## MAX3295A
designator U?
20Mbps, +3.3V, SOT23 RS-485/  RS-422 Transmitters; ASiD Part Number: MAX3295A-AS
footprint MY_SOT23-6
pins: 1 DI (in), 2 VCC (power), 3 DE (in), 4 Z (out), 5 GND (power), 6 Y (out)

## MBR2060CT
designator D?
1 Amp Diode; ASiD Part Number: MBR2060CT-AS
footprint MY_TO220V_heatsink
footprint My_TO220
pins: 1 A, 2 K, 3 A

## Mini_USB
designator J?
USB 2.0, Right Angle, SMT, B Type, Receptacle, 5 Position, Black; ASiD Part Number: Mini_USB-AS
footprint My_USB
signal-integrity model USB2.0
footprint MY_USB_B
footprint MY_USB_HOST
footprint MY_USBV (Footprint not found)
pins: 1 VBUS (power) "Power", 2 D- (in) "-DATA", 3 D+ (in) "+DATA", 4 GND (power) "Ground", 5 SHLD "Shield"

## MIW4132
designator M?  (value not drawn)
DC/DC CONVERTER 18-75V input ,Output 5V 1A; ASiD Part Number: MIW4132-AS
footprint MY_MIW4132
pins: 2 -Vin, 14 +Vout, 16 -Vout, 22 +Vin

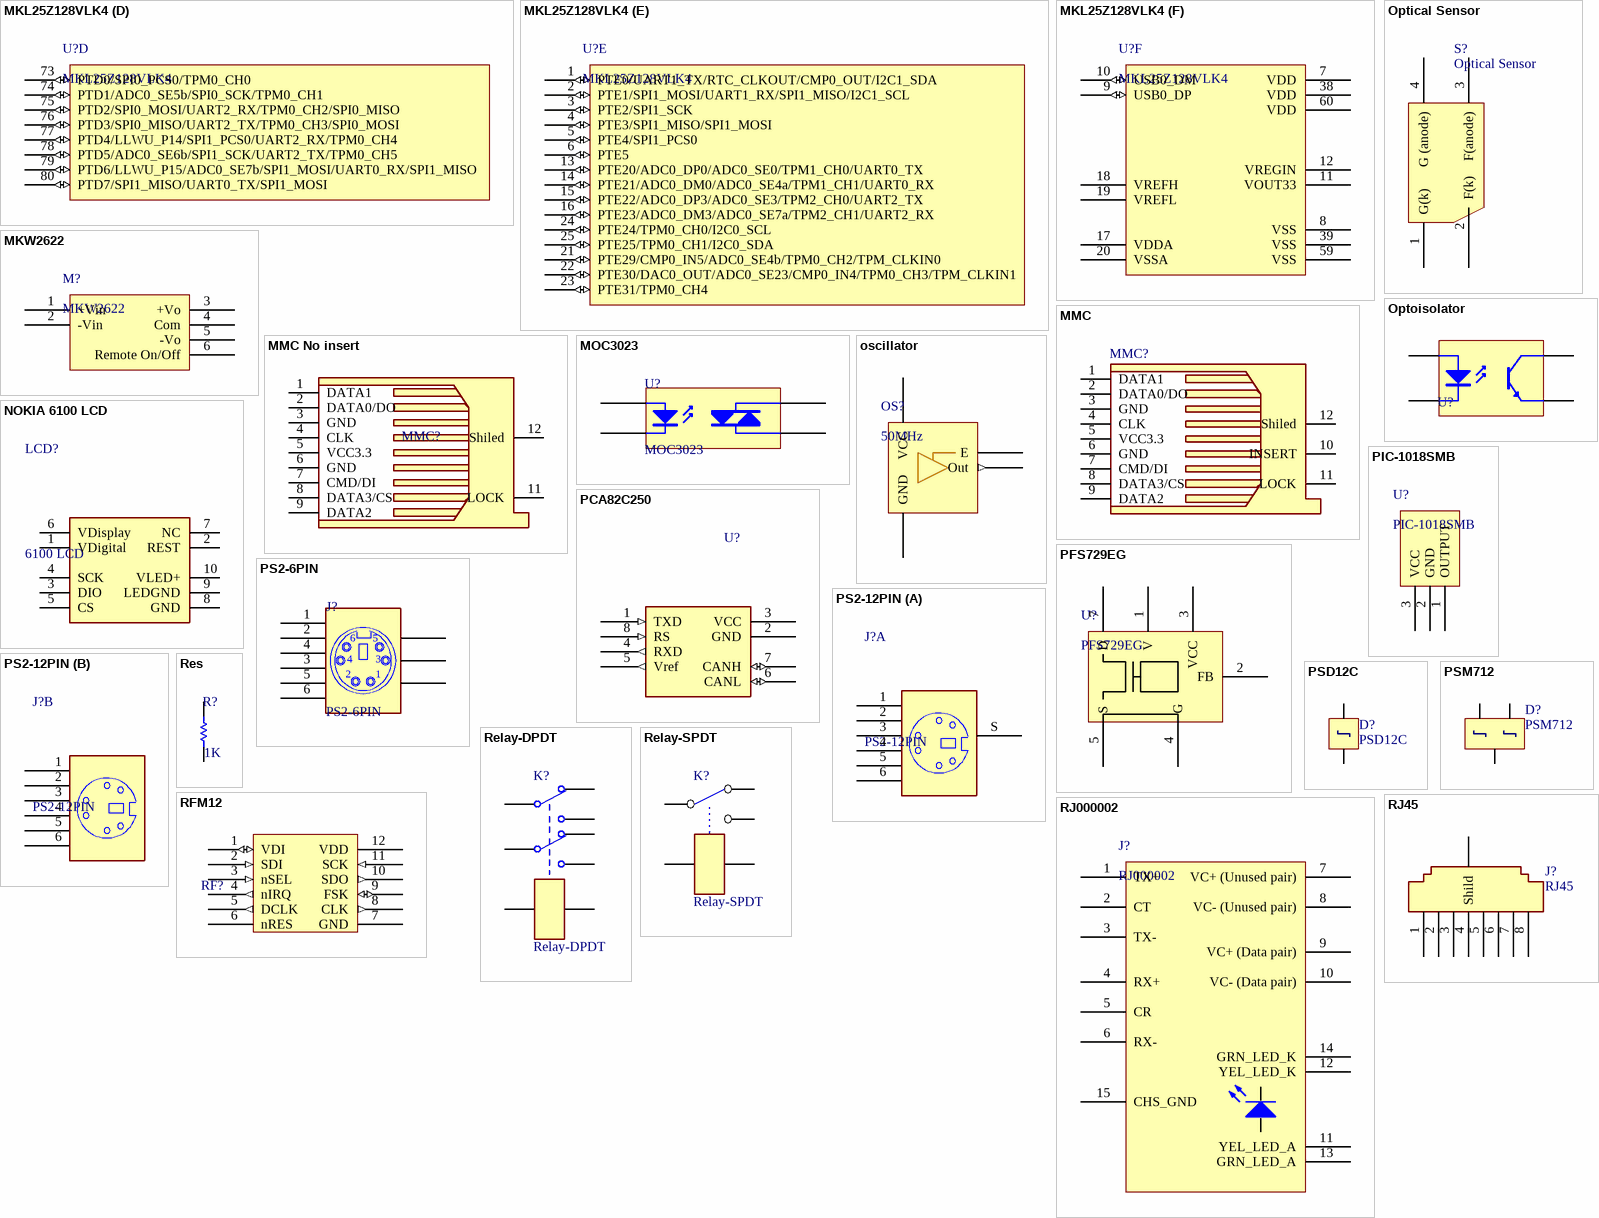
[diagram p13: symbols MKL25Z128VLK4 to RJ45]

## MKL25Z128VLK4
designator U?
KL25 Sub-Family Microcontroller; ASiD Part Number: MKL25Z128VLK4-AS
footprint MY_TQFP80
part A pins: 26 PTA0/SWD_CLK/TSI0_CH1/TPM0_CH5 (io), 27 PTA1/TSI0_CH2/UART0_RX/ TPM2_CH0 (io), 28 PTA2/TSI0_CH3/UART0_TX/TPM2_CH1 (io), 29 PTA3/SWD_DIO/TSI0_CH4/I2C1_SCL/TPM0_CH0 (io), 30 PTA4/NMI_b/TSI0_CH5/I2C1_SDA/TPM0_CH1 (io), 31 PTA5/USB_CLKIN/TPM0_CH2 (io), 32 PTA12/TPM1_CH0 (io), 33 PTA13/TPM1_CH1 (io), 34 PTA14/SPI0_PCS0/UART0_TX (io), 35 PTA15/SPI0_SCK/UART0_RX (io), 36 PTA16/SPI0_MOSI/SPI0_MISO (io), 37 PTA17/SPI0_MISO/SPI0_MOSI (io), 40 PTA18/EXTAL0/UART1_RX/TPM_CLKIN0 (io), 41 PTA19/XTAL0/UART1_TX/TPM_CLKIN1/LPTMR0_ALT1 (io), 42 PTA20/RESET_b (io)
part B pins: 43 PTB0/LLWU_P5/ADC0_SE8/TSI0_CH0/I2C0_SCL/TPM1_CH0 (io), 44 PTB1/ADC0_SE9/TSI0_CH6/I2C0_SDA/TPM1_CH1 (io), 45 PTB2/ADC0_SE12/TSI0_CH7/I2C0_SCL/TPM2_CH0 (io), 46 PTB3/ADC0_SE13/TSI0_CH8/I2C0_SDA/TPM2_CH1 (io), 47 PTB8/EXTRG_IN (io), 48 PTB9 (io), 49 PTB10/SPI1_PCS0 (io), 50 PTB11/SPI1_SCK (io), 51 PTB16/TSI0_CH9/SPI1_MOSI/UART0_RX/TPM_CLKIN0/SPI1_MISO (io), 52 PTB17/TSI0_CH10/SPI1_MISO/UART0_TX/TPM_CLKIN1/SPI1_MOSI (io), 53 PTB18/TSI0_CH11/TPM2_CH0 (io), 54 PTB19/TSI0_CH12/TPM2_CH1 (io)
part C pins: 55 PTC0/ADC0_SE14/TSI0_CH13/EXTRG_IN/CMP0_OUT (io), 56 PTC1/LLWU_P6/RTC_CLKIN/ADC0_SE15/TSI0_CH14/I2C1_SCL/TPM0_CH0 (io), 57 PTC2/ADC0_SE11/TSI0_CH15/I2C1_SDA/TPM0_CH1 (io), 58 PTC3/LLWU_P7/UART1_RX/TPM0_CH2/CLKOUT (io), 61 PTC4/LLWU_P8/SPI0_PCS0/UART1_TX/TPM0_CH3 (io), 62 PTC5/LLWU_P9/SPI0_SCK LPTMR0_ALT2/CMP0_OUT (io), 63 PTC6/LLWU_P10/CMP0_IN0/SPI0_MOSI/EXTRG_IN/SPI0_MISO (io), 64 PTC7/CMP0_IN1/SPI0_MISO/SPI0_MOSI (io), 65 PTC8/CMP0_IN2/I2C0_SCL/TPM0_CH4 (io), 66 PTC9/CMP0_IN3/I2C0_SDA/TPM0_CH5 (io), 67 PTC10/I2C1_SCL (io), 68 PTC11/I2C1_SDA (io), 69 PTC12/TPM_CLKIN0 (io), 70 PTC13/TPM_CLKIN1 (io), 71 PTC16 (io), 72 PTC17 (io)
part D pins: 73 PTD0/SPI0_PCS0/TPM0_CH0 (io), 74 PTD1/ADC0_SE5b/SPI0_SCK/TPM0_CH1 (io), 75 PTD2/SPI0_MOSI/UART2_RX/TPM0_CH2/SPI0_MISO (io), 76 PTD3/SPI0_MISO/UART2_TX/TPM0_CH3/SPI0_MOSI (io), 77 PTD4/LLWU_P14/SPI1_PCS0/UART2_RX/TPM0_CH4 (io), 78 PTD5/ADC0_SE6b/SPI1_SCK/UART2_TX/TPM0_CH5 (io), 79 PTD6/LLWU_P15/ADC0_SE7b/SPI1_MOSI/UART0_RX/SPI1_MISO (io), 80 PTD7/SPI1_MISO/UART0_TX/SPI1_MOSI (io)
part E pins: 1 PTE0/UART1_TX/RTC_CLKOUT/CMP0_OUT/I2C1_SDA (io), 2 PTE1/SPI1_MOSI/UART1_RX/SPI1_MISO/I2C1_SCL (io), 3 PTE2/SPI1_SCK (io), 4 PTE3/SPI1_MISO/SPI1_MOSI (io), 5 PTE4/SPI1_PCS0 (io), 6 PTE5 (io), 13 PTE20/ADC0_DP0/ADC0_SE0/TPM1_CH0/UART0_TX (io), 14 PTE21/ADC0_DM0/ADC0_SE4a/TPM1_CH1/UART0_RX (io), 15 PTE22/ADC0_DP3/ADC0_SE3/TPM2_CH0/UART2_TX (io), 16 PTE23/ADC0_DM3/ADC0_SE7a/TPM2_CH1/UART2_RX (io), 21 PTE29/CMP0_IN5/ADC0_SE4b/TPM0_CH2/TPM_CLKIN0 (io), 22 PTE30/DAC0_OUT/ADC0_SE23/CMP0_IN4/TPM0_CH3/TPM_CLKIN1 (io), 23 PTE31/TPM0_CH4 (io), 24 PTE24/TPM0_CH0/I2C0_SCL (io), 25 PTE25/TPM0_CH1/I2C0_SDA (io)
part F pins: 7 VDD (power), 8 VSS (power), 9 USB0_DP (io), 10 USB0_DM (io), 11 VOUT33 (power), 12 VREGIN (power), 17 VDDA (power), 18 VREFH (power), 19 VREFL (power), 20 VSSA (power), 38 VDD (power), 39 VSS (power), 59 VSS (power), 60 VDD (power)

## MKW2622
designator M?
15W, Ultra-Wide Input Range, Single & Dual Output DC/DC Converters
footprint MY_MKW2622 (Footprint not found)
pins: 1 +Vin, 2 -Vin, 3 +Vo, 4 Com, 5 -Vo, 6 Remote On/Off

## MMC
designator MMC?
MMC/SD Card; ASiD Part Number: MMC-AS
footprint MY_MMC
footprint MY_SD_MMC
pins: 1 DATA1, 2 DATA0/DO, 3 GND, 4 CLK, 5 VCC3.3, 6 GND, 7 CMD/DI, 8 DATA3/CS, 9 DATA2, 10 INSERT, 11 LOCK, 12 Shiled

## MMC No insert
designator MMC?
MMC/SD Card; ASiD Part Number: MMC No insert-AS
footprint MY_SD_MMC_1
footprint MY_MicroSD
pins: 1 DATA1, 2 DATA0/DO, 3 GND, 4 CLK, 5 VCC3.3, 6 GND, 7 CMD/DI, 8 DATA3/CS, 9 DATA2, 11 LOCK, 12 Shiled

## MOC3023
designator U?
Opto-Triac; ASiD Part Number: MOC3023-AS
footprint My_DIP6
footprint MY_SO6-GW300
pins: 1, 2, 4, 6

## NOKIA 6100 LCD
designator LCD?, comment 6100 LCD
NOKIA 6100 LCD; ASiD Part Number: NOKIA 6100 LCD-AS
footprint MY_NOKIA6100_LCD
pins: 1 VDigital, 2 REST, 3 DIO, 4 SCK, 5 CS, 6 VDisplay, 7 NC, 8 GND, 9 LEDGND, 10 VLED+

## Optical Sensor
designator S?
photo reflector on floor; ASiD Part Number: Optical Sensor-AS
footprint My_SNS 4
pins: 1 G(k), 2 F(k), 3 F(anode), 4 G (anode)

## Optoisolator
designator U?  (value not drawn)
ASiD Part Number: Optoisolator-AS
footprint My_opto
footprint MY_Photo_Reflector
footprint MY_OPTO_SMD4
footprint MY_OPTO_SMD4-7
footprint MY_LTH301-05
pins: 1 A, 2 K, 3 E, 4 C

## oscillator
designator OS?, comment 50MHz
Standard crystal oscillator 14-DIL; ASiD Part Number: oscillator-AS; Value: 50MHz
footprint MY_SMD_Osilator
footprint MY_oscillator_8
footprint MY_oscillator_14
pins: 1 E, 7 GND (power), 8 Out (out), 14 VCC (power)

## PCA82C250
designator U?  (value not drawn)
CAN controller interface; ASiD Part Number: PCA82C250-AS
footprint My_SOIC_P8
pins: 1 TXD (in), 2 GND (power), 3 VCC (power), 4 RXD (out), 5 Vref (out), 6 CANL (io), 7 CANH (io), 8 RS (in)

## PFS729EG
designator U?
High Power PFC Controller with Integrated  High-Voltage MOSFET; ASiD Part Number: PFS729EG-AS
footprint MY_eSIP-7G
pins: 1 V, 2 FB, 3 VCC (power), 4 G, 5 S, 7 D

## PIC-1018SMB
designator U?
Infrared Receiver Module; ASiD Part Number: PIC-1018SMB-AS
footprint MY_PIC_1018SMB
footprint MY_PIC_1018SMB_K
pins: 1 OUTPUT (oc), 2 GND (power), 3 VCC (power)

## PS2-6PIN
designator J?
6 Pin Through Hole PS2 Socket (Kycon P/N); ASiD Part Number: PS2-6PIN-AS
footprint My_PS2-6PIN
signal-integrity model Connector
pins: 1, 2, 3, 4, 5, 6, MH1 "Mounting Fixture", MH2 "Mounting Fixture", MH3 "Mounting Fixture"